# Altium footprint library Ixora.PcbLib: 199 footprints (part 13 of 13)
Each footprint in its own frame and in the unit in brackets; x right, y up, seen from the top. Pads: shape width x height; smd on the part's side, far side on the other; paste and mask are expansions set on the pad; w line width, h text height; cw(c..) or ccw(c..) is an arc to the next point about the centre after c.
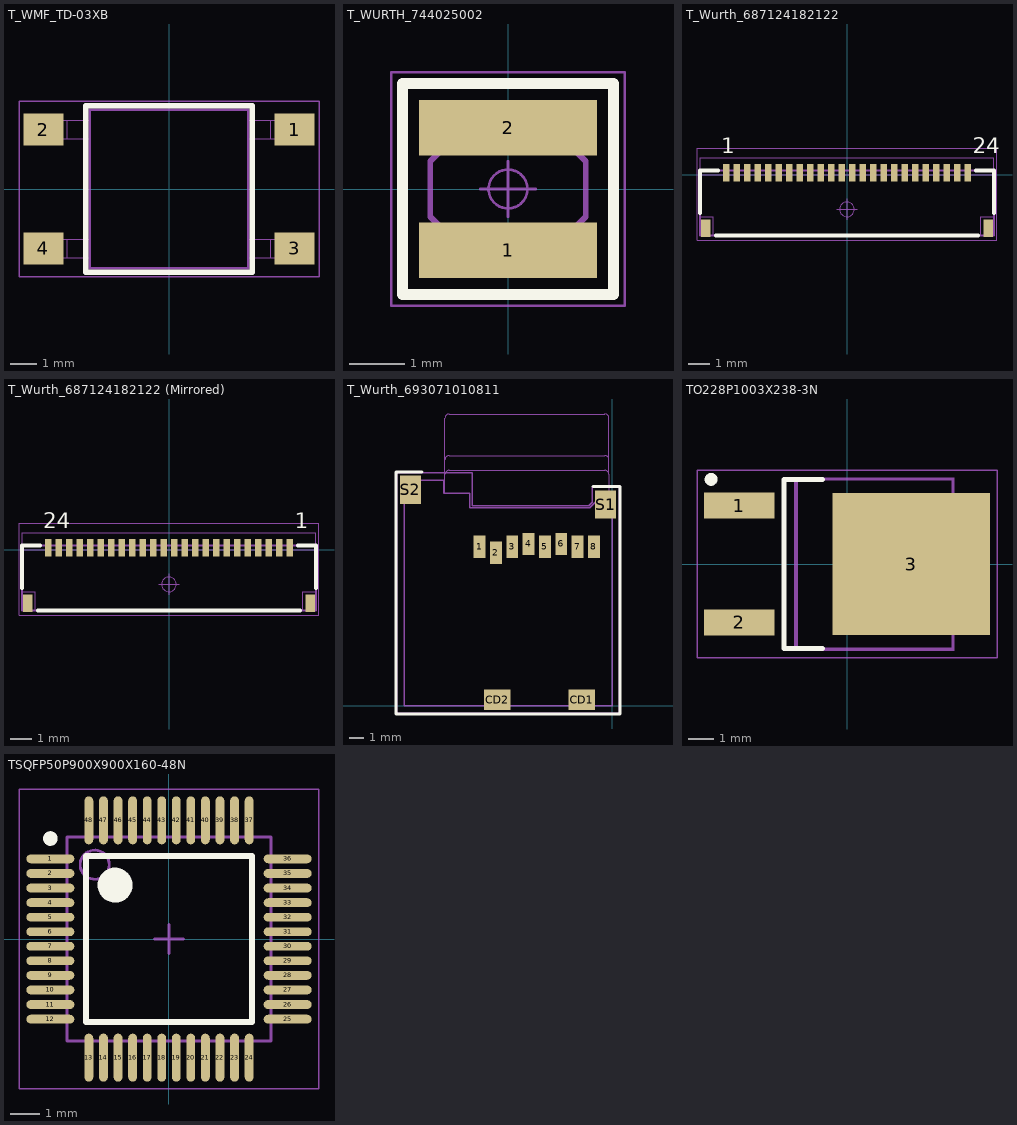
[diagram p12: the footprints below, top view; thin cyan lines are the x and y axes]

## T_WMF_TD-03XB [mm] "Push Button"
height 7.8
pads (4):
  rect 1.5x1.2 smd: 1(4.75,2.25) 2(-4.75,2.25) 3(4.75,-2.25) 4(-4.75,-2.25)
Top Overlay:
  lines w0.2: -3.15,-3.15 3.15,-3.15 3.15,3.15 -3.15,3.15 -3.15,-3.15
Mechanical 1:
  lines w0.05: -5.675,-3.321 5.675,-3.321 5.675,3.321 -5.675,3.321 -5.675,-3.321
Mechanical 2:
  lines w0.001: -4.05,-2.6 -4.05,-1.9 ; -4.05,1.9 -4.05,2.6 ; -3.85,-2.6 -3.85,-1.9 ; -3.85,1.9 -3.85,2.6 ; -3,-2.6 -5.15,-2.6 -5.15,-1.9 -3,-1.9 ; -3,1.9 -5.15,1.9 -5.15,2.6 -3,2.6 ; 3,-2.6 5.15,-2.6 5.15,-1.9 3,-1.9 ; 3,1.9 5.15,1.9 5.15,2.6 3,2.6 ; 3.85,-2.6 3.85,-1.9 ; 3.85,1.9 3.85,2.6 ; 4.05,-2.6 4.05,-1.9 ; 4.05,1.9 4.05,2.6 ; -3,-3 3,-3 3,3 -3,3 -3,-3
Mechanical 3:
  lines w0.1: -3,-3 3,-3 3,3 -3,3 -3,-3
3D body: height 3.5, standoff 3.49, extent -3,-3 3,3
3D body: height 7.8, standoff 3.5, extent -1.736,-1.747 1.75,1.747
3D body: height 3.49, standoff 0, extent -3,-3 3,3
3D body: height 3.7, standoff 3.5, extent 1.754,1.751 2.75,2.749
3D body: height 3.7, standoff 3.5, extent -2.746,1.751 -1.75,2.749
3D body: height 3.7, standoff 3.5, extent -2.746,-2.749 -1.75,-1.751
3D body: height 3.7, standoff 3.5, extent 1.754,-2.749 2.75,-1.751
3D body: height 0.2, standoff 0, extent -5.15,1.9 -4.05,2.6
3D body: height 0.2, standoff 0, extent -5.15,-2.6 -4.05,-1.9
3D body: height 0.2, standoff 0, extent 4.05,-2.6 5.15,-1.9
3D body: height 0.2, standoff 0, extent 4.05,1.9 5.15,2.6
3D body: height 1, standoff 0, extent 3.85,1.9 4.05,2.6
3D body: height 1, standoff 0, extent 3.85,-2.6 4.05,-1.9
3D body: height 1, standoff 0, extent -4.05,-2.6 -3.85,-1.9
3D body: height 1, standoff 0, extent -4.05,1.9 -3.85,2.6
3D body: height 1, standoff 0.8, extent -3.85,1.9 -3,2.6
3D body: height 1, standoff 0.8, extent -3.85,-2.6 -3,-1.9
3D body: height 1, standoff 0.8, extent 3,-2.6 3.85,-1.9
3D body: height 1, standoff 0.8, extent 3,1.9 3.85,2.6

## T_WURTH_744025002 [mm] "POWER-CHOKE"
height 2.8
pads (2):
  rect 3.2x1 smd: 1(0,-1.1) 2(0,1.1)
Top Overlay:
  lines w0.2: -1.9,-1.9 1.9,-1.9 1.9,1.9 -1.9,1.9 -1.9,-1.9
Mechanical 1:
  lines w0.05: -2.1,-2.1 -2.1,2.1 2.1,2.1 2.1,-2.1 -2.1,-2.1
Mechanical 2:
  lines w0.01: -1.4,-0.5 -1.4,0.5 -0.5,1.4 0.5,1.4 1.4,0.5 1.4,-0.5 0.5,-1.4 -0.5,-1.4 -1.4,-0.5
Mechanical 3:
  circle w0.05: c0,0 r0.35
  lines w0.05: -0.5,0 0.5,0 ; 0,-0.5 0,0.5
  lines w0.1: -1.4,-0.5 -1.4,0.5 -0.5,1.4 0.5,1.4 1.4,0.5 1.4,-0.5 0.5,-1.4 -0.5,-1.4 -1.4,-0.5
3D body: height 2.81, standoff 0, extent -0.996,-1 0.996,0.996
3D body: height 2.8, standoff 0, extent -1.4,-1.4 1.4,1.4

## T_Wurth_687124182122 [mm] "FPC Connector, 24 Position, Top and Bottom 0.020\" (0.50mm) Surface Mount, Right Angle"
height 0.96
pads (26):
  rect 0.3x0.85 smd: 1(-5.75,0.095) 2(-5.25,0.095) 3(-4.75,0.095) 4(-4.25,0.095) 5(-3.75,0.095) 6(-3.25,0.095) 7(-2.75,0.095) 8(-2.25,0.095) 9(-1.75,0.095) 10(-1.25,0.095) 11(-0.75,0.095) 12(-0.25,0.095) 13(0.25,0.095) 14(0.75,0.095) 15(1.25,0.095) 16(1.75,0.095) 17(2.25,0.095) 18(2.75,0.095) 19(3.25,0.095) 20(3.75,0.095) 21(4.25,0.095) 22(4.75,0.095) 23(5.25,0.095) 24(5.75,0.095)
  rect 0.45x0.85 smd: ""(-6.725,-2.55) ""(6.725,-2.55)
Top Overlay:
  lines w0.2: -7,-1.822 -7,0.2 -6.147,0.2 ; -6.25,-2.9 6.25,-2.9 ; 6.147,0.2 7,0.2 7,-1.822
  text "24" at 6,1.016 h0.75
  text "1" at -6,1.016 h0.75
Mechanical 1:
  circle w0.05: c0,-1.651 r0.35
  lines w0.05: -0.5,-1.651 0.5,-1.651 ; 0,-2.151 0,-1.151 ; -7.137,-3.124 -7.137,1.27 7.137,1.27 7.137,-3.124 -7.137,-3.124
Mechanical 2:
  lines w0.001: -7,-2.9 7,-2.9 7,0 -7,0
  lines w0.005: -7,-2 -6.375,-2 -6.375,-2.9 ; -7,0 7,0 ; -7,0.2 7,0.2 ; 6.375,-2.9 6.375,-2 7,-2 ; -7,-2.9 7,-2.9 7,0.8 -7,0.8 -7,-2.9
Mechanical 3:
  lines w0.1: -7,-2.896 -7,0.2 7,0.2 7,-2.896 -7,-2.896
3D body "STEP-687124182122-rev1.stp": height 0.98, standoff -0.01, extent -7,-2.9 7,0.6

## T_Wurth_687124182122 (Mirrored) [mm] "FPC Connector(Mirrored), 24 Position, Top and Bottom 0.020\" (0.50mm) Surface Mount, Right Angle"
height 0.96
pads (26):
  rect 0.3x0.85 smd: 1(5.75,0.095) 2(5.25,0.095) 3(4.75,0.095) 4(4.25,0.095) 5(3.75,0.095) 6(3.25,0.095) 7(2.75,0.095) 8(2.25,0.095) 9(1.75,0.095) 10(1.25,0.095) 11(0.75,0.095) 12(0.25,0.095) 13(-0.25,0.095) 14(-0.75,0.095) 15(-1.25,0.095) 16(-1.75,0.095) 17(-2.25,0.095) 18(-2.75,0.095) 19(-3.25,0.095) 20(-3.75,0.095) 21(-4.25,0.095) 22(-4.75,0.095) 23(-5.25,0.095) 24(-5.75,0.095)
  rect 0.45x0.85 smd: ""(-6.725,-2.55) ""(6.725,-2.55)
Top Overlay:
  lines w0.2: -7,-1.822 -7,0.2 -6.147,0.2 ; -6.25,-2.9 6.25,-2.9 ; 6.147,0.2 7,0.2 7,-1.822
  text "24" at -6,1.016 h0.75
  text "1" at 6,1.016 h0.75
Mechanical 1:
  circle w0.05: c0,-1.651 r0.35
  lines w0.05: -0.5,-1.651 0.5,-1.651 ; 0,-2.151 0,-1.151 ; -7.137,-3.124 -7.137,1.27 7.137,1.27 7.137,-3.124 -7.137,-3.124
Mechanical 2:
  lines w0.001: -7,-2.9 7,-2.9 7,0 -7,0
  lines w0.005: -7,-2 -6.375,-2 -6.375,-2.9 ; -7,0 7,0 ; -7,0.2 7,0.2 ; 6.375,-2.9 6.375,-2 7,-2 ; -7,-2.9 7,-2.9 7,0.8 -7,0.8 -7,-2.9
Mechanical 3:
  lines w0.1: -7,-2.896 -7,0.2 7,0.2 7,-2.896 -7,-2.896
3D body "STEP-687124182122-rev1.stp": height 0.98, standoff -0.01, extent -7,-2.9 7,0.6

## T_Wurth_693071010811 [mm] "MicroSD Holder, Push-Pust Type,"
height 1.98
pads (12):
  rect 0.8x1.5 smd: 1(-8.94,10.7) 2(-7.84,10.3) 3(-6.74,10.7) 4(-5.64,10.9) 5(-4.54,10.7) 6(-3.44,10.9) 7(-2.34,10.7) 8(-1.24,10.7)
  rect 1.8x1.4 smd: CD1(-2.05,0.4) CD2(-7.75,0.4)
  rect 1.4x1.9 smd: S1(-0.45,13.55) S2(-13.6,14.55)
Top Overlay:
  lines w0.2: -12.802,15.748 -14.554,15.748 -14.554,-0.559 0.508,-0.559 0.508,14.757 -1.295,14.757
Mechanical 1:
  lines w0.1: -14.503,-0.508 -14.503,15.697 -9.423,15.697 -9.423,13.462 -1.575,13.462 -1.346,13.691 -1.346,14.707 0.457,14.707 0.457,-0.508 -14.503,-0.508
Mechanical 2:
  lines w0.01: -11.27,14.326 -11.27,15.575 ; -11.27,16.575 cw(c-10.995,16.575) -10.995,16.85 -0.495,16.85 cw(c-0.495,16.575) -0.22,16.575 ; -0.22,14.2 -0.22,15.575 ccw(c-0.495,15.575) -0.495,15.85 -10.995,15.85 ccw(c-10.995,15.575) -11.27,15.575 ; -0.22,15.578 -0.22,19.375 ccw(c-0.495,19.375) -0.495,19.65 -10.995,19.65 ccw(c-10.995,19.375) -11.27,19.375 -11.27,15.575 ; -14,0 -14,15.2 -11.354,15.2 -11.354,14.326 -9.601,14.326 -9.601,13.335 -1.524,13.335 -0.659,14.2 0,14.2 0,0 -14,0
Mechanical 3:
  lines w0.1: -14,0 -14,15.2 -11.354,15.2 -11.354,14.326 -9.601,14.326 -9.601,13.335 -1.524,13.335 -0.659,14.2 0,14.2 0,0 -14,0
3D body "693071010811.stp": height 1.83, standoff -0.07, extent -14,0 0,15.2
3D body "User Library-Micro SD Card.step": height 1.8, standoff 0.69, extent -11.269,4.623 -0.22,19.65

## TO228P1003X238-3N [mm]
pads (3):
  rect 2.75x1 smd: 1(-4.2,2.28) 2(-4.2,-2.28)
  rect 6.15x5.55 smd: 3(2.5,0)
Top Overlay:
  circle w0.25: c-5.3,3.3 r0.125
  lines w0.2: -0.95,-3.3 -2.45,-3.3 -2.45,3.3 -0.95,3.3
Top Paste:
  region: 0.14,-2.06 2.14,-2.06 2.14,-0.36 0.14,-0.36
  region: 2.86,-2.06 4.86,-2.06 4.86,-0.36 2.86,-0.36
  region: 0.14,0.36 2.14,0.36 2.14,2.06 0.14,2.06
  region: 2.86,0.36 4.86,0.36 4.86,2.06 2.86,2.06
Mechanical 1:
  circle w0.05: c0,0 r0.35
  lines w0.05: -0.5,0 0.5,0 ; 0,-0.5 0,0.5 ; -5.85,-3.65 5.85,-3.65 5.85,3.65 -5.85,3.65 -5.85,-3.65
Mechanical 2:
  lines w0.001: -2.032,-3.365 4.188,-3.365 4.188,3.365 -2.032,3.365 -2.032,-3.365
Mechanical 3:
  lines w0.1: 4.125,-2.668 4.419,-2.668 5.015,-2.006 5.015,2.006 4.419,2.668 4.125,2.668 ; -1.97,-3.302 4.125,-3.302 4.125,3.302 -1.97,3.302 -1.97,-3.302

## TSQFP50P900X900X160-48N [mm]
pads (48):
  oval 1.65x0.3 smd: 1(-4.075,2.75) 2(-4.075,2.25) 3(-4.075,1.75) 4(-4.075,1.25) 5(-4.075,0.75) 6(-4.075,0.25) 7(-4.075,-0.25) 8(-4.075,-0.75) 9(-4.075,-1.25) 10(-4.075,-1.75) 11(-4.075,-2.25) 12(-4.075,-2.75) 25(4.075,-2.75) 26(4.075,-2.25) 27(4.075,-1.75) 28(4.075,-1.25) 29(4.075,-0.75) 30(4.075,-0.25) 31(4.075,0.25) 32(4.075,0.75) 33(4.075,1.25) 34(4.075,1.75) 35(4.075,2.25) 36(4.075,2.75)
  oval 0.3x1.65 smd: 13(-2.75,-4.075) 14(-2.25,-4.075) 15(-1.75,-4.075) 16(-1.25,-4.075) 17(-0.75,-4.075) 18(-0.25,-4.075) 19(0.25,-4.075) 20(0.75,-4.075) 21(1.25,-4.075) 22(1.75,-4.075) 23(2.25,-4.075) 24(2.75,-4.075) 37(2.75,4.075) 38(2.25,4.075) 39(1.75,4.075) 40(1.25,4.075) 41(0.75,4.075) 42(0.25,4.075) 43(-0.25,4.075) 44(-0.75,4.075) 45(-1.25,4.075) 46(-1.75,4.075) 47(-2.25,4.075) 48(-2.75,4.075)
Top Overlay:
  circle w0.25: c-4.075,3.45 r0.125
  circle w0.6: c-1.85,1.85 r0.3
  lines w0.2: -2.85,-2.85 -2.85,2.85 2.85,2.85 2.85,-2.85 -2.85,-2.85
Mechanical 1:
  lines w0.05: -5.15,-5.15 -5.15,5.15 5.15,5.15 5.15,-5.15 -5.15,-5.15
Mechanical 2:
  lines w0.01: -3.5,-3.5 3.5,-3.5 3.5,3.5 -3.5,3.5 -3.5,-3.5
Mechanical 3:
  circle w0.1: c-2.55,2.55 r0.5
  lines w0.1: -0.5,0 0.5,0 ; 0,-0.5 0,0.5 ; -3.5,-3.5 3.5,-3.5 3.5,3.5 -3.5,3.5 -3.5,-3.5
3D body: height 1.6, standoff 0.25, extent -3.5,-3.5 3.5,3.5